# Altium schematic symbol library jlcpcb_2025_04_capacitors_extended_0603.schlib: 3668 symbols (part 4 of 20) (continued)
## 0603N7R5B500CT
designator C?  Capacitance: 7.5pF  (hidden comment: *)
Capacitor, Ceramic (MLCC), 7.5pF, 50V, NP0, SMD 0603; Manufacturer: Walsin Tech Corp; Manufacturer Part Number: 0603N7R5B500CT; Package Size: 0603; JLCPCB Basic Part: No; JLCPCB Part Number: C458910; Supplier 1: LCSC; Category: Capacitors - MLCC; Supplier Part Number 1: C458910; Voltage Rating: 50V; Temperature Coefficient: NP0; RoHS: Yes; ComponentLink1Description: Datasheet; ComponentLink1URL: https://wmsc.lcsc.com/wmsc/upload/file/pdf/v2/lcsc/2304140030_Walsin-Tech-Corp-0603N7R5B500CT_C458910.pdf; ComponentLink2Description: JLCPCB Part URL; ComponentLink2URL: https://jlcpcb.com/partdetail/C458910; ComponentLink3Description: LCSC Part URL; ComponentLink3URL: https://lcsc.com/product-detail/Multilayer-Ceramic-Capacitors-MLCC---SMD-SMT_Walsin-Tech-Corp-Walsin-Tech-Corp-0603N7R5B500CT_C458910.html
footprint CAP-0603 (0603 (1608M) Capacitor)
pins: 1, 2

## 0603N7R5C500CT
designator C?  Capacitance: 7.5pF  (hidden comment: *)
Capacitor, Ceramic (MLCC), 7.5pF, 50V, NP0, SMD 0603; Manufacturer: Walsin Tech Corp; Manufacturer Part Number: 0603N7R5C500CT; Package Size: 0603; JLCPCB Basic Part: No; JLCPCB Part Number: C296068; Supplier 1: LCSC; Category: Capacitors - MLCC; Supplier Part Number 1: C296068; Voltage Rating: 50V; Temperature Coefficient: NP0; RoHS: Yes; ComponentLink1Description: Datasheet; ComponentLink1URL: https://wmsc.lcsc.com/wmsc/upload/file/pdf/v2/lcsc/2304140030_Walsin-Tech-Corp-0603N7R5C500CT_C296068.pdf; ComponentLink2Description: JLCPCB Part URL; ComponentLink2URL: https://jlcpcb.com/partdetail/C296068; ComponentLink3Description: LCSC Part URL; ComponentLink3URL: https://lcsc.com/product-detail/Multilayer-Ceramic-Capacitors-MLCC---SMD-SMT_Walsin-Tech-Corp-Walsin-Tech-Corp-0603N7R5C500CT_C296068.html
footprint CAP-0603 (0603 (1608M) Capacitor)
pins: 1, 2

## 0603N8R0B500CT
designator C?  Capacitance: 8pF  (hidden comment: *)
Capacitor, Ceramic (MLCC), 8pF, 50V, NP0, SMD 0603; Manufacturer: Walsin Tech Corp; Manufacturer Part Number: 0603N8R0B500CT; Package Size: 0603; JLCPCB Basic Part: No; JLCPCB Part Number: C314305; Supplier 1: LCSC; Category: Capacitors - MLCC; Supplier Part Number 1: C314305; Voltage Rating: 50V; Temperature Coefficient: NP0; RoHS: Yes; ComponentLink1Description: Datasheet; ComponentLink1URL: https://wmsc.lcsc.com/wmsc/upload/file/pdf/v2/lcsc/2304140030_Walsin-Tech-Corp-0603N8R0B500CT_C314305.pdf; ComponentLink2Description: JLCPCB Part URL; ComponentLink2URL: https://jlcpcb.com/partdetail/C314305; ComponentLink3Description: LCSC Part URL; ComponentLink3URL: https://lcsc.com/product-detail/Multilayer-Ceramic-Capacitors-MLCC---SMD-SMT_Walsin-Tech-Corp-Walsin-Tech-Corp-0603N8R0B500CT_C314305.html
footprint CAP-0603 (0603 (1608M) Capacitor)
pins: 1, 2

## 0603N8R0C500CT
designator C?  Capacitance: 8pF  (hidden comment: *)
Capacitor, Ceramic (MLCC), 8pF, 50V, NP0, SMD 0603; Manufacturer: Walsin Tech Corp; Manufacturer Part Number: 0603N8R0C500CT; Package Size: 0603; JLCPCB Basic Part: No; JLCPCB Part Number: C388066; Supplier 1: LCSC; Category: Capacitors - MLCC; Supplier Part Number 1: C388066; Voltage Rating: 50V; Temperature Coefficient: NP0; RoHS: Yes; ComponentLink1Description: Datasheet; ComponentLink1URL: https://wmsc.lcsc.com/wmsc/upload/file/pdf/v2/lcsc/2304140030_Walsin-Tech-Corp-0603N8R0C500CT_C388066.pdf; ComponentLink2Description: JLCPCB Part URL; ComponentLink2URL: https://jlcpcb.com/partdetail/C388066; ComponentLink3Description: LCSC Part URL; ComponentLink3URL: https://lcsc.com/product-detail/Multilayer-Ceramic-Capacitors-MLCC---SMD-SMT_Walsin-Tech-Corp-Walsin-Tech-Corp-0603N8R0C500CT_C388066.html
footprint CAP-0603 (0603 (1608M) Capacitor)
pins: 1, 2

## 0603N8R0D500CT
designator C?  Capacitance: 8pF  (hidden comment: *)
Capacitor, Ceramic (MLCC), 8pF, 50V, NP0, SMD 0603; Manufacturer: Walsin Tech Corp; Manufacturer Part Number: 0603N8R0D500CT; Package Size: 0603; JLCPCB Basic Part: No; JLCPCB Part Number: C388067; Supplier 1: LCSC; Category: Capacitors - MLCC; Supplier Part Number 1: C388067; Voltage Rating: 50V; Temperature Coefficient: NP0; RoHS: Yes; ComponentLink1Description: Datasheet; ComponentLink1URL: https://wmsc.lcsc.com/wmsc/upload/file/pdf/v2/lcsc/2304140030_Walsin-Tech-Corp-0603N8R0D500CT_C388067.pdf; ComponentLink2Description: JLCPCB Part URL; ComponentLink2URL: https://jlcpcb.com/partdetail/C388067; ComponentLink3Description: LCSC Part URL; ComponentLink3URL: https://lcsc.com/product-detail/Multilayer-Ceramic-Capacitors-MLCC---SMD-SMT_Walsin-Tech-Corp-Walsin-Tech-Corp-0603N8R0D500CT_C388067.html
footprint CAP-0603 (0603 (1608M) Capacitor)
pins: 1, 2

## 0603N8R2B500CT
designator C?  Capacitance: 8.2pF  (hidden comment: *)
Capacitor, Ceramic (MLCC), 8.2pF, 50V, NP0, SMD 0603; Manufacturer: Walsin Tech Corp; Manufacturer Part Number: 0603N8R2B500CT; Package Size: 0603; JLCPCB Basic Part: No; JLCPCB Part Number: C123599; Supplier 1: LCSC; Category: Capacitors - MLCC; Supplier Part Number 1: C123599; Voltage Rating: 50V; Temperature Coefficient: NP0; RoHS: Yes; ComponentLink1Description: Datasheet; ComponentLink1URL: https://wmsc.lcsc.com/wmsc/upload/file/pdf/v2/lcsc/2304140030_Walsin-Tech-Corp-0603N8R2B500CT_C123599.pdf; ComponentLink2Description: JLCPCB Part URL; ComponentLink2URL: https://jlcpcb.com/partdetail/C123599; ComponentLink3Description: LCSC Part URL; ComponentLink3URL: https://lcsc.com/product-detail/Multilayer-Ceramic-Capacitors-MLCC---SMD-SMT_Walsin-Tech-Corp-Walsin-Tech-Corp-0603N8R2B500CT_C123599.html
footprint CAP-0603 (0603 (1608M) Capacitor)
pins: 1, 2

## 0603N8R2C500CT
designator C?  Capacitance: 8.2pF  (hidden comment: *)
Capacitor, Ceramic (MLCC), 8.2pF, 50V, NP0, SMD 0603; Manufacturer: Walsin Tech Corp; Manufacturer Part Number: 0603N8R2C500CT; Package Size: 0603; JLCPCB Basic Part: No; JLCPCB Part Number: C388068; Supplier 1: LCSC; Category: Capacitors - MLCC; Supplier Part Number 1: C388068; Voltage Rating: 50V; Temperature Coefficient: NP0; RoHS: Yes; ComponentLink1Description: Datasheet; ComponentLink1URL: https://wmsc.lcsc.com/wmsc/upload/file/pdf/v2/lcsc/2304140030_Walsin-Tech-Corp-0603N8R2C500CT_C388068.pdf; ComponentLink2Description: JLCPCB Part URL; ComponentLink2URL: https://jlcpcb.com/partdetail/C388068; ComponentLink3Description: LCSC Part URL; ComponentLink3URL: https://lcsc.com/product-detail/Multilayer-Ceramic-Capacitors-MLCC---SMD-SMT_Walsin-Tech-Corp-Walsin-Tech-Corp-0603N8R2C500CT_C388068.html
footprint CAP-0603 (0603 (1608M) Capacitor)
pins: 1, 2

## 0603N8R2D500CT
designator C?  Capacitance: 8.2pF  (hidden comment: *)
Capacitor, Ceramic (MLCC), 8.2pF, 50V, NP0, SMD 0603; Manufacturer: Walsin Tech Corp; Manufacturer Part Number: 0603N8R2D500CT; Package Size: 0603; JLCPCB Basic Part: No; JLCPCB Part Number: C123601; Supplier 1: LCSC; Category: Capacitors - MLCC; Supplier Part Number 1: C123601; Voltage Rating: 50V; Temperature Coefficient: NP0; RoHS: Yes; ComponentLink1Description: Datasheet; ComponentLink1URL: https://wmsc.lcsc.com/wmsc/upload/file/pdf/v2/lcsc/2304140030_Walsin-Tech-Corp-0603N8R2D500CT_C123601.pdf; ComponentLink2Description: JLCPCB Part URL; ComponentLink2URL: https://jlcpcb.com/partdetail/C123601; ComponentLink3Description: LCSC Part URL; ComponentLink3URL: https://lcsc.com/product-detail/Multilayer-Ceramic-Capacitors-MLCC---SMD-SMT_Walsin-Tech-Corp-Walsin-Tech-Corp-0603N8R2D500CT_C123601.html
footprint CAP-0603 (0603 (1608M) Capacitor)
pins: 1, 2

## 0603N9R0B500CT
designator C?  Capacitance: 9pF  (hidden comment: *)
Capacitor, Ceramic (MLCC), 9pF, 50V, NP0, SMD 0603; Manufacturer: Walsin Tech Corp; Manufacturer Part Number: 0603N9R0B500CT; Package Size: 0603; JLCPCB Basic Part: No; JLCPCB Part Number: C335534; Supplier 1: LCSC; Category: Capacitors - MLCC; Supplier Part Number 1: C335534; Voltage Rating: 50V; Temperature Coefficient: NP0; RoHS: Yes; ComponentLink1Description: Datasheet; ComponentLink1URL: https://wmsc.lcsc.com/wmsc/upload/file/pdf/v2/lcsc/2304140030_Walsin-Tech-Corp-0603N9R0B500CT_C335534.pdf; ComponentLink2Description: JLCPCB Part URL; ComponentLink2URL: https://jlcpcb.com/partdetail/C335534; ComponentLink3Description: LCSC Part URL; ComponentLink3URL: https://lcsc.com/product-detail/Multilayer-Ceramic-Capacitors-MLCC---SMD-SMT_Walsin-Tech-Corp-Walsin-Tech-Corp-0603N9R0B500CT_C335534.html
footprint CAP-0603 (0603 (1608M) Capacitor)
pins: 1, 2

## 0603N9R0C500CT
designator C?  Capacitance: 9pF  (hidden comment: *)
Capacitor, Ceramic (MLCC), 9pF, 50V, NP0, SMD 0603; Manufacturer: Walsin Tech Corp; Manufacturer Part Number: 0603N9R0C500CT; Package Size: 0603; JLCPCB Basic Part: No; JLCPCB Part Number: C880859; Supplier 1: LCSC; Category: Capacitors - MLCC; Supplier Part Number 1: C880859; Voltage Rating: 50V; Temperature Coefficient: NP0; RoHS: Yes; ComponentLink1Description: Datasheet; ComponentLink1URL: https://wmsc.lcsc.com/wmsc/upload/file/pdf/v2/lcsc/2304140030_Walsin-Tech-Corp-0603N9R0C500CT_C880859.pdf; ComponentLink2Description: JLCPCB Part URL; ComponentLink2URL: https://jlcpcb.com/partdetail/C880859; ComponentLink3Description: LCSC Part URL; ComponentLink3URL: https://lcsc.com/product-detail/Multilayer-Ceramic-Capacitors-MLCC---SMD-SMT_Walsin-Tech-Corp-Walsin-Tech-Corp-0603N9R0C500CT_C880859.html
footprint CAP-0603 (0603 (1608M) Capacitor)
pins: 1, 2

## 0603N9R1D500CT
designator C?  Capacitance: 9.1pF  (hidden comment: *)
Capacitor, Ceramic (MLCC), 9.1pF, 50V, NP0, SMD 0603; Manufacturer: Walsin Tech Corp; Manufacturer Part Number: 0603N9R1D500CT; Package Size: 0603; JLCPCB Basic Part: No; JLCPCB Part Number: C424829; Supplier 1: LCSC; Category: Capacitors - MLCC; Supplier Part Number 1: C424829; Voltage Rating: 50V; Temperature Coefficient: NP0; RoHS: Yes; ComponentLink1Description: Datasheet; ComponentLink1URL: https://wmsc.lcsc.com/wmsc/upload/file/pdf/v2/lcsc/2304140030_Walsin-Tech-Corp-0603N9R1D500CT_C424829.pdf; ComponentLink2Description: JLCPCB Part URL; ComponentLink2URL: https://jlcpcb.com/partdetail/C424829; ComponentLink3Description: LCSC Part URL; ComponentLink3URL: https://lcsc.com/product-detail/Multilayer-Ceramic-Capacitors-MLCC---SMD-SMT_Walsin-Tech-Corp-Walsin-Tech-Corp-0603N9R1D500CT_C424829.html
footprint CAP-0603 (0603 (1608M) Capacitor)
pins: 1, 2

## 0603N100D500CT
designator C?  Capacitance: 10pF  (hidden comment: *)
Capacitor, Ceramic (MLCC), 10pF, 50V, NP0, SMD 0603; Manufacturer: Walsin Tech Corp; Manufacturer Part Number: 0603N100D500CT; Package Size: 0603; JLCPCB Basic Part: No; JLCPCB Part Number: C296044; Supplier 1: LCSC; Category: Capacitors - MLCC; Supplier Part Number 1: C296044; Voltage Rating: 50V; Temperature Coefficient: NP0; RoHS: Yes; ComponentLink1Description: Datasheet; ComponentLink1URL: https://wmsc.lcsc.com/wmsc/upload/file/pdf/v2/lcsc/2304140030_Walsin-Tech-Corp-0603N100D500CT_C296044.pdf; ComponentLink2Description: JLCPCB Part URL; ComponentLink2URL: https://jlcpcb.com/partdetail/C296044; ComponentLink3Description: LCSC Part URL; ComponentLink3URL: https://lcsc.com/product-detail/Multilayer-Ceramic-Capacitors-MLCC---SMD-SMT_Walsin-Tech-Corp-Walsin-Tech-Corp-0603N100D500CT_C296044.html
footprint CAP-0603 (0603 (1608M) Capacitor)
pins: 1, 2

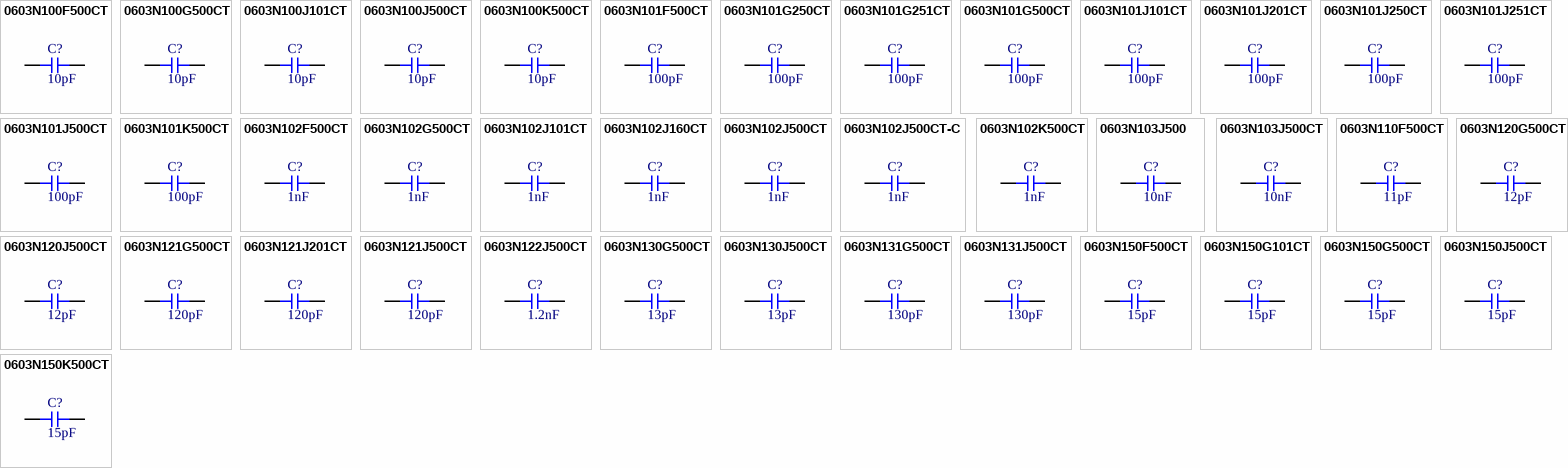
[diagram p16: symbols 0603N100F500CT to 0603N150K500CT]

## 0603N100F500CT
designator C?  Capacitance: 10pF  (hidden comment: *)
Capacitor, Ceramic (MLCC), 10pF, ±1%, 50V, NP0, ±1%, SMD 0603; Manufacturer: Walsin Tech Corp; Manufacturer Part Number: 0603N100F500CT; Package Size: 0603; JLCPCB Basic Part: No; JLCPCB Part Number: C458889; Supplier 1: LCSC; Category: Capacitors - MLCC; Supplier Part Number 1: C458889; Tolerance: ±1%; Voltage Rating: 50V; Temperature Coefficient: NP0; RoHS: Yes; ComponentLink1Description: Datasheet; ComponentLink1URL: https://wmsc.lcsc.com/wmsc/upload/file/pdf/v2/lcsc/2304140030_Walsin-Tech-Corp-0603N100F500CT_C458889.pdf; ComponentLink2Description: JLCPCB Part URL; ComponentLink2URL: https://jlcpcb.com/partdetail/C458889; ComponentLink3Description: LCSC Part URL; ComponentLink3URL: https://lcsc.com/product-detail/Multilayer-Ceramic-Capacitors-MLCC---SMD-SMT_Walsin-Tech-Corp-Walsin-Tech-Corp-0603N100F500CT_C458889.html
footprint CAP-0603 (0603 (1608M) Capacitor)
pins: 1, 2

## 0603N100G500CT
designator C?  Capacitance: 10pF  (hidden comment: *)
Capacitor, Ceramic (MLCC), 10pF, ±2%, 50V, NP0, ±2%, SMD 0603; Manufacturer: Walsin Tech Corp; Manufacturer Part Number: 0603N100G500CT; Package Size: 0603; JLCPCB Basic Part: No; JLCPCB Part Number: C237161; Supplier 1: LCSC; Category: Capacitors - MLCC; Supplier Part Number 1: C237161; Tolerance: ±2%; Voltage Rating: 50V; Temperature Coefficient: NP0; RoHS: Yes; ComponentLink1Description: Datasheet; ComponentLink1URL: https://wmsc.lcsc.com/wmsc/upload/file/pdf/v2/lcsc/2304140030_Walsin-Tech-Corp-0603N100G500CT_C237161.pdf; ComponentLink2Description: JLCPCB Part URL; ComponentLink2URL: https://jlcpcb.com/partdetail/C237161; ComponentLink3Description: LCSC Part URL; ComponentLink3URL: https://lcsc.com/product-detail/Multilayer-Ceramic-Capacitors-MLCC---SMD-SMT_Walsin-Tech-Corp-Walsin-Tech-Corp-0603N100G500CT_C237161.html
footprint CAP-0603 (0603 (1608M) Capacitor)
pins: 1, 2

## 0603N100J101CT
designator C?  Capacitance: 10pF  (hidden comment: *)
Capacitor, Ceramic (MLCC), 10pF, ±5%, 100V, NP0, ±5%, SMD 0603; Manufacturer: Walsin Tech Corp; Manufacturer Part Number: 0603N100J101CT; Package Size: 0603; JLCPCB Basic Part: No; JLCPCB Part Number: C338151; Supplier 1: LCSC; Category: Capacitors - MLCC; Supplier Part Number 1: C338151; Tolerance: ±5%; Voltage Rating: 100V; Temperature Coefficient: NP0; RoHS: Yes; ComponentLink1Description: Datasheet; ComponentLink1URL: https://wmsc.lcsc.com/wmsc/upload/file/pdf/v2/lcsc/2304140030_Walsin-Tech-Corp-0603N100J101CT_C338151.pdf; ComponentLink2Description: JLCPCB Part URL; ComponentLink2URL: https://jlcpcb.com/partdetail/C338151; ComponentLink3Description: LCSC Part URL; ComponentLink3URL: https://lcsc.com/product-detail/Multilayer-Ceramic-Capacitors-MLCC---SMD-SMT_Walsin-Tech-Corp-Walsin-Tech-Corp-0603N100J101CT_C338151.html
footprint CAP-0603 (0603 (1608M) Capacitor)
pins: 1, 2

## 0603N100J500CT
designator C?  Capacitance: 10pF  (hidden comment: *)
Capacitor, Ceramic (MLCC), 10pF, ±5%, 50V, NP0, ±5%, SMD 0603; Manufacturer: Walsin Tech Corp; Manufacturer Part Number: 0603N100J500CT; Package Size: 0603; JLCPCB Basic Part: No; JLCPCB Part Number: C152928; Supplier 1: LCSC; Category: Capacitors - MLCC; Supplier Part Number 1: C152928; Tolerance: ±5%; Voltage Rating: 50V; Temperature Coefficient: NP0; RoHS: Yes; ComponentLink1Description: Datasheet; ComponentLink1URL: https://wmsc.lcsc.com/wmsc/upload/file/pdf/v2/lcsc/2304140030_Walsin-Tech-Corp-0603N100J500CT_C152928.pdf; ComponentLink2Description: JLCPCB Part URL; ComponentLink2URL: https://jlcpcb.com/partdetail/C152928; ComponentLink3Description: LCSC Part URL; ComponentLink3URL: https://lcsc.com/product-detail/Multilayer-Ceramic-Capacitors-MLCC---SMD-SMT_Walsin-Tech-Corp-Walsin-Tech-Corp-0603N100J500CT_C152928.html
footprint CAP-0603 (0603 (1608M) Capacitor)
pins: 1, 2

## 0603N100K500CT
designator C?  Capacitance: 10pF  (hidden comment: *)
Capacitor, Ceramic (MLCC), 10pF, ±10%, 50V, NP0, ±10%, SMD 0603; Manufacturer: Walsin Tech Corp; Manufacturer Part Number: 0603N100K500CT; Package Size: 0603; JLCPCB Basic Part: No; JLCPCB Part Number: C296045; Supplier 1: LCSC; Category: Capacitors - MLCC; Supplier Part Number 1: C296045; Tolerance: ±10%; Voltage Rating: 50V; Temperature Coefficient: NP0; RoHS: Yes; ComponentLink1Description: Datasheet; ComponentLink1URL: https://wmsc.lcsc.com/wmsc/upload/file/pdf/v2/lcsc/2304140030_Walsin-Tech-Corp-0603N100K500CT_C296045.pdf; ComponentLink2Description: JLCPCB Part URL; ComponentLink2URL: https://jlcpcb.com/partdetail/C296045; ComponentLink3Description: LCSC Part URL; ComponentLink3URL: https://lcsc.com/product-detail/Multilayer-Ceramic-Capacitors-MLCC---SMD-SMT_Walsin-Tech-Corp-Walsin-Tech-Corp-0603N100K500CT_C296045.html
footprint CAP-0603 (0603 (1608M) Capacitor)
pins: 1, 2

## 0603N101F500CT
designator C?  Capacitance: 100pF  (hidden comment: *)
Capacitor, Ceramic (MLCC), 100pF, ±1%, 50V, NP0, ±1%, SMD 0603; Manufacturer: Walsin Tech Corp; Manufacturer Part Number: 0603N101F500CT; Package Size: 0603; JLCPCB Basic Part: No; JLCPCB Part Number: C555556; Supplier 1: LCSC; Category: Capacitors - MLCC; Supplier Part Number 1: C555556; Tolerance: ±1%; Voltage Rating: 50V; Temperature Coefficient: NP0; RoHS: Yes; ComponentLink1Description: Datasheet; ComponentLink1URL: https://wmsc.lcsc.com/wmsc/upload/file/pdf/v2/lcsc/2304140030_Walsin-Tech-Corp-0603N101F500CT_C555556.pdf; ComponentLink2Description: JLCPCB Part URL; ComponentLink2URL: https://jlcpcb.com/partdetail/C555556; ComponentLink3Description: LCSC Part URL; ComponentLink3URL: https://lcsc.com/product-detail/Multilayer-Ceramic-Capacitors-MLCC---SMD-SMT_Walsin-Tech-Corp-Walsin-Tech-Corp-0603N101F500CT_C555556.html
footprint CAP-0603 (0603 (1608M) Capacitor)
pins: 1, 2

## 0603N101G250CT
designator C?  Capacitance: 100pF  (hidden comment: *)
Capacitor, Ceramic (MLCC), 100pF, ±2%, 25V, NP0, ±2%, SMD 0603; Manufacturer: Walsin Tech Corp; Manufacturer Part Number: 0603N101G250CT; Package Size: 0603; JLCPCB Basic Part: No; JLCPCB Part Number: C458891; Supplier 1: LCSC; Category: Capacitors - MLCC; Supplier Part Number 1: C458891; Tolerance: ±2%; Voltage Rating: 25V; Temperature Coefficient: NP0; RoHS: Yes; ComponentLink1Description: Datasheet; ComponentLink1URL: https://wmsc.lcsc.com/wmsc/upload/file/pdf/v2/lcsc/2304140030_Walsin-Tech-Corp-0603N101G250CT_C458891.pdf; ComponentLink2Description: JLCPCB Part URL; ComponentLink2URL: https://jlcpcb.com/partdetail/C458891; ComponentLink3Description: LCSC Part URL; ComponentLink3URL: https://lcsc.com/product-detail/Multilayer-Ceramic-Capacitors-MLCC---SMD-SMT_Walsin-Tech-Corp-Walsin-Tech-Corp-0603N101G250CT_C458891.html
footprint CAP-0603 (0603 (1608M) Capacitor)
pins: 1, 2

## 0603N101G251CT
designator C?  Capacitance: 100pF  (hidden comment: *)
Capacitor, Ceramic (MLCC), 100pF, ±2%, 250V, NP0, ±2%, SMD 0603; Manufacturer: Walsin Tech Corp; Manufacturer Part Number: 0603N101G251CT; Package Size: 0603; JLCPCB Basic Part: No; JLCPCB Part Number: C469647; Supplier 1: LCSC; Category: Capacitors - MLCC; Supplier Part Number 1: C469647; Tolerance: ±2%; Voltage Rating: 250V; Temperature Coefficient: NP0; RoHS: Yes; ComponentLink1Description: Datasheet; ComponentLink1URL: https://wmsc.lcsc.com/wmsc/upload/file/pdf/v2/lcsc/2304140030_Walsin-Tech-Corp-0603N101G251CT_C469647.pdf; ComponentLink2Description: JLCPCB Part URL; ComponentLink2URL: https://jlcpcb.com/partdetail/C469647; ComponentLink3Description: LCSC Part URL; ComponentLink3URL: https://lcsc.com/product-detail/Multilayer-Ceramic-Capacitors-MLCC---SMD-SMT_Walsin-Tech-Corp-Walsin-Tech-Corp-0603N101G251CT_C469647.html
footprint CAP-0603 (0603 (1608M) Capacitor)
pins: 1, 2

## 0603N101G500CT
designator C?  Capacitance: 100pF  (hidden comment: *)
Capacitor, Ceramic (MLCC), 100pF, ±2%, 50V, NP0, ±2%, SMD 0603; Manufacturer: Walsin Tech Corp; Manufacturer Part Number: 0603N101G500CT; Package Size: 0603; JLCPCB Basic Part: No; JLCPCB Part Number: C296046; Supplier 1: LCSC; Category: Capacitors - MLCC; Supplier Part Number 1: C296046; Tolerance: ±2%; Voltage Rating: 50V; Temperature Coefficient: NP0; RoHS: Yes; ComponentLink1Description: Datasheet; ComponentLink1URL: https://wmsc.lcsc.com/wmsc/upload/file/pdf/v2/lcsc/2304140030_Walsin-Tech-Corp-0603N101G500CT_C296046.pdf; ComponentLink2Description: JLCPCB Part URL; ComponentLink2URL: https://jlcpcb.com/partdetail/C296046; ComponentLink3Description: LCSC Part URL; ComponentLink3URL: https://lcsc.com/product-detail/Multilayer-Ceramic-Capacitors-MLCC---SMD-SMT_Walsin-Tech-Corp-Walsin-Tech-Corp-0603N101G500CT_C296046.html
footprint CAP-0603 (0603 (1608M) Capacitor)
pins: 1, 2

## 0603N101J101CT
designator C?  Capacitance: 100pF  (hidden comment: *)
Capacitor, Ceramic (MLCC), 100pF, ±5%, 100V, NP0, ±5%, SMD 0603; Manufacturer: Walsin Tech Corp; Manufacturer Part Number: 0603N101J101CT; Package Size: 0603; JLCPCB Basic Part: No; JLCPCB Part Number: C77445; Supplier 1: LCSC; Category: Capacitors - MLCC; Supplier Part Number 1: C77445; Tolerance: ±5%; Voltage Rating: 100V; Temperature Coefficient: NP0; RoHS: Yes; ComponentLink1Description: Datasheet; ComponentLink1URL: https://wmsc.lcsc.com/wmsc/upload/file/pdf/v2/lcsc/2304140030_Walsin-Tech-Corp-0603N101J101CT_C77445.pdf; ComponentLink2Description: JLCPCB Part URL; ComponentLink2URL: https://jlcpcb.com/partdetail/C77445; ComponentLink3Description: LCSC Part URL; ComponentLink3URL: https://lcsc.com/product-detail/Multilayer-Ceramic-Capacitors-MLCC---SMD-SMT_Walsin-Tech-Corp-Walsin-Tech-Corp-0603N101J101CT_C77445.html
footprint CAP-0603 (0603 (1608M) Capacitor)
pins: 1, 2

## 0603N101J201CT
designator C?  Capacitance: 100pF  (hidden comment: *)
Capacitor, Ceramic (MLCC), 100pF, ±5%, 200V, NP0, ±5%, SMD 0603; Manufacturer: Walsin Tech Corp; Manufacturer Part Number: 0603N101J201CT; Package Size: 0603; JLCPCB Basic Part: No; JLCPCB Part Number: C396710; Supplier 1: LCSC; Category: Capacitors - MLCC; Supplier Part Number 1: C396710; Tolerance: ±5%; Voltage Rating: 200V; Temperature Coefficient: NP0; RoHS: Yes; ComponentLink1Description: Datasheet; ComponentLink1URL: https://wmsc.lcsc.com/wmsc/upload/file/pdf/v2/lcsc/2304140030_Walsin-Tech-Corp-0603N101J201CT_C396710.pdf; ComponentLink2Description: JLCPCB Part URL; ComponentLink2URL: https://jlcpcb.com/partdetail/C396710; ComponentLink3Description: LCSC Part URL; ComponentLink3URL: https://lcsc.com/product-detail/Multilayer-Ceramic-Capacitors-MLCC---SMD-SMT_Walsin-Tech-Corp-Walsin-Tech-Corp-0603N101J201CT_C396710.html
footprint CAP-0603 (0603 (1608M) Capacitor)
pins: 1, 2

## 0603N101J250CT
designator C?  Capacitance: 100pF  (hidden comment: *)
Capacitor, Ceramic (MLCC), 100pF, ±5%, 25V, NP0, ±5%, SMD 0603; Manufacturer: Walsin Tech Corp; Manufacturer Part Number: 0603N101J250CT; Package Size: 0603; JLCPCB Basic Part: No; JLCPCB Part Number: C458892; Supplier 1: LCSC; Category: Capacitors - MLCC; Supplier Part Number 1: C458892; Tolerance: ±5%; Voltage Rating: 25V; Temperature Coefficient: NP0; RoHS: Yes; ComponentLink1Description: Datasheet; ComponentLink1URL: https://wmsc.lcsc.com/wmsc/upload/file/pdf/v2/lcsc/2304140030_Walsin-Tech-Corp-0603N101J250CT_C458892.pdf; ComponentLink2Description: JLCPCB Part URL; ComponentLink2URL: https://jlcpcb.com/partdetail/C458892; ComponentLink3Description: LCSC Part URL; ComponentLink3URL: https://lcsc.com/product-detail/Multilayer-Ceramic-Capacitors-MLCC---SMD-SMT_Walsin-Tech-Corp-Walsin-Tech-Corp-0603N101J250CT_C458892.html
footprint CAP-0603 (0603 (1608M) Capacitor)
pins: 1, 2

## 0603N101J251CT
designator C?  Capacitance: 100pF  (hidden comment: *)
Capacitor, Ceramic (MLCC), 100pF, ±5%, 250V, NP0, ±5%, SMD 0603; Manufacturer: Walsin Tech Corp; Manufacturer Part Number: 0603N101J251CT; Package Size: 0603; JLCPCB Basic Part: No; JLCPCB Part Number: C77446; Supplier 1: LCSC; Category: Capacitors - MLCC; Supplier Part Number 1: C77446; Tolerance: ±5%; Voltage Rating: 250V; Temperature Coefficient: NP0; RoHS: Yes; ComponentLink1Description: Datasheet; ComponentLink1URL: https://wmsc.lcsc.com/wmsc/upload/file/pdf/v2/lcsc/2304140030_Walsin-Tech-Corp-0603N101J251CT_C77446.pdf; ComponentLink2Description: JLCPCB Part URL; ComponentLink2URL: https://jlcpcb.com/partdetail/C77446; ComponentLink3Description: LCSC Part URL; ComponentLink3URL: https://lcsc.com/product-detail/Multilayer-Ceramic-Capacitors-MLCC---SMD-SMT_Walsin-Tech-Corp-Walsin-Tech-Corp-0603N101J251CT_C77446.html
footprint CAP-0603 (0603 (1608M) Capacitor)
pins: 1, 2

## 0603N101J500CT
designator C?  Capacitance: 100pF  (hidden comment: *)
Capacitor, Ceramic (MLCC), 100pF, ±5%, 50V, NP0, ±5%, SMD 0603; Manufacturer: Walsin Tech Corp; Manufacturer Part Number: 0603N101J500CT; Package Size: 0603; JLCPCB Basic Part: No; JLCPCB Part Number: C335544; Supplier 1: LCSC; Category: Capacitors - MLCC; Supplier Part Number 1: C335544; Tolerance: ±5%; Voltage Rating: 50V; Temperature Coefficient: NP0; RoHS: Yes; ComponentLink1Description: Datasheet; ComponentLink1URL: https://wmsc.lcsc.com/wmsc/upload/file/pdf/v2/lcsc/2304140030_Walsin-Tech-Corp-0603N101J500CT_C335544.pdf; ComponentLink2Description: JLCPCB Part URL; ComponentLink2URL: https://jlcpcb.com/partdetail/C335544; ComponentLink3Description: LCSC Part URL; ComponentLink3URL: https://lcsc.com/product-detail/Multilayer-Ceramic-Capacitors-MLCC---SMD-SMT_Walsin-Tech-Corp-Walsin-Tech-Corp-0603N101J500CT_C335544.html
footprint CAP-0603 (0603 (1608M) Capacitor)
pins: 1, 2

## 0603N101K500CT
designator C?  Capacitance: 100pF  (hidden comment: *)
Capacitor, Ceramic (MLCC), 100pF, ±10%, 50V, NP0, ±10%, SMD 0603; Manufacturer: Walsin Tech Corp; Manufacturer Part Number: 0603N101K500CT; Package Size: 0603; JLCPCB Basic Part: No; JLCPCB Part Number: C296047; Supplier 1: LCSC; Category: Capacitors - MLCC; Supplier Part Number 1: C296047; Tolerance: ±10%; Voltage Rating: 50V; Temperature Coefficient: NP0; RoHS: Yes; ComponentLink1Description: Datasheet; ComponentLink1URL: https://wmsc.lcsc.com/wmsc/upload/file/pdf/v2/lcsc/2304140030_Walsin-Tech-Corp-0603N101K500CT_C296047.pdf; ComponentLink2Description: JLCPCB Part URL; ComponentLink2URL: https://jlcpcb.com/partdetail/C296047; ComponentLink3Description: LCSC Part URL; ComponentLink3URL: https://lcsc.com/product-detail/Multilayer-Ceramic-Capacitors-MLCC---SMD-SMT_Walsin-Tech-Corp-Walsin-Tech-Corp-0603N101K500CT_C296047.html
footprint CAP-0603 (0603 (1608M) Capacitor)
pins: 1, 2

## 0603N102F500CT
designator C?  Capacitance: 1nF  (hidden comment: *)
Capacitor, Ceramic (MLCC), 1nF, ±1%, 50V, NP0, ±1%, SMD 0603; Manufacturer: Walsin Tech Corp; Manufacturer Part Number: 0603N102F500CT; Package Size: 0603; JLCPCB Basic Part: No; JLCPCB Part Number: C384777; Supplier 1: LCSC; Category: Capacitors - MLCC; Supplier Part Number 1: C384777; Tolerance: ±1%; Voltage Rating: 50V; Temperature Coefficient: NP0; RoHS: Yes; ComponentLink1Description: Datasheet; ComponentLink1URL: https://wmsc.lcsc.com/wmsc/upload/file/pdf/v2/lcsc/2304140030_Walsin-Tech-Corp-0603N102F500CT_C384777.pdf; ComponentLink2Description: JLCPCB Part URL; ComponentLink2URL: https://jlcpcb.com/partdetail/C384777; ComponentLink3Description: LCSC Part URL; ComponentLink3URL: https://lcsc.com/product-detail/Multilayer-Ceramic-Capacitors-MLCC---SMD-SMT_Walsin-Tech-Corp-Walsin-Tech-Corp-0603N102F500CT_C384777.html
footprint CAP-0603 (0603 (1608M) Capacitor)
pins: 1, 2

## 0603N102G500CT
designator C?  Capacitance: 1nF  (hidden comment: *)
Capacitor, Ceramic (MLCC), 1nF, ±2%, 50V, NP0, ±2%, SMD 0603; Manufacturer: Walsin Tech Corp; Manufacturer Part Number: 0603N102G500CT; Package Size: 0603; JLCPCB Basic Part: No; JLCPCB Part Number: C338154; Supplier 1: LCSC; Category: Capacitors - MLCC; Supplier Part Number 1: C338154; Tolerance: ±2%; Voltage Rating: 50V; Temperature Coefficient: NP0; RoHS: Yes; ComponentLink1Description: Datasheet; ComponentLink1URL: https://wmsc.lcsc.com/wmsc/upload/file/pdf/v2/lcsc/2304140030_Walsin-Tech-Corp-0603N102G500CT_C338154.pdf; ComponentLink2Description: JLCPCB Part URL; ComponentLink2URL: https://jlcpcb.com/partdetail/C338154; ComponentLink3Description: LCSC Part URL; ComponentLink3URL: https://lcsc.com/product-detail/Multilayer-Ceramic-Capacitors-MLCC---SMD-SMT_Walsin-Tech-Corp-Walsin-Tech-Corp-0603N102G500CT_C338154.html
footprint CAP-0603 (0603 (1608M) Capacitor)
pins: 1, 2

## 0603N102J101CT
designator C?  Capacitance: 1nF  (hidden comment: *)
Capacitor, Ceramic (MLCC), 1nF, ±5%, 100V, NP0, ±5%, SMD 0603; Manufacturer: Walsin Tech Corp; Manufacturer Part Number: 0603N102J101CT; Package Size: 0603; JLCPCB Basic Part: No; JLCPCB Part Number: C388030; Supplier 1: LCSC; Category: Capacitors - MLCC; Supplier Part Number 1: C388030; Tolerance: ±5%; Voltage Rating: 100V; Temperature Coefficient: NP0; RoHS: Yes; ComponentLink1Description: Datasheet; ComponentLink1URL: https://wmsc.lcsc.com/wmsc/upload/file/pdf/v2/lcsc/2304140030_Walsin-Tech-Corp-0603N102J101CT_C388030.pdf; ComponentLink2Description: JLCPCB Part URL; ComponentLink2URL: https://jlcpcb.com/partdetail/C388030; ComponentLink3Description: LCSC Part URL; ComponentLink3URL: https://lcsc.com/product-detail/Multilayer-Ceramic-Capacitors-MLCC---SMD-SMT_Walsin-Tech-Corp-Walsin-Tech-Corp-0603N102J101CT_C388030.html
footprint CAP-0603 (0603 (1608M) Capacitor)
pins: 1, 2

## 0603N102J160CT
designator C?  Capacitance: 1nF  (hidden comment: *)
Capacitor, Ceramic (MLCC), 1nF, ±5%, 16V, NP0, ±5%, SMD 0603; Manufacturer: Walsin Tech Corp; Manufacturer Part Number: 0603N102J160CT; Package Size: 0603; JLCPCB Basic Part: No; JLCPCB Part Number: C302049; Supplier 1: LCSC; Category: Capacitors - MLCC; Supplier Part Number 1: C302049; Tolerance: ±5%; Voltage Rating: 16V; Temperature Coefficient: NP0; RoHS: Yes; ComponentLink1Description: Datasheet; ComponentLink1URL: https://wmsc.lcsc.com/wmsc/upload/file/pdf/v2/lcsc/2304140030_Walsin-Tech-Corp-0603N102J160CT_C302049.pdf; ComponentLink2Description: JLCPCB Part URL; ComponentLink2URL: https://jlcpcb.com/partdetail/C302049; ComponentLink3Description: LCSC Part URL; ComponentLink3URL: https://lcsc.com/product-detail/Multilayer-Ceramic-Capacitors-MLCC---SMD-SMT_Walsin-Tech-Corp-Walsin-Tech-Corp-0603N102J160CT_C302049.html
footprint CAP-0603 (0603 (1608M) Capacitor)
pins: 1, 2

## 0603N102J500CT
designator C?  Capacitance: 1nF  (hidden comment: *)
Capacitor, Ceramic (MLCC), 1nF, ±5%, 50V, NP0, ±5%, SMD 0603; Manufacturer: Walsin Tech Corp; Manufacturer Part Number: 0603N102J500CT; Package Size: 0603; JLCPCB Basic Part: No; JLCPCB Part Number: C340644; Supplier 1: LCSC; Category: Capacitors - MLCC; Supplier Part Number 1: C340644; Tolerance: ±5%; Voltage Rating: 50V; Temperature Coefficient: NP0; RoHS: Yes; ComponentLink1Description: Datasheet; ComponentLink1URL: https://wmsc.lcsc.com/wmsc/upload/file/pdf/v2/lcsc/2304140030_Walsin-Tech-Corp-0603N102J500CT_C340644.pdf; ComponentLink2Description: JLCPCB Part URL; ComponentLink2URL: https://jlcpcb.com/partdetail/C340644; ComponentLink3Description: LCSC Part URL; ComponentLink3URL: https://lcsc.com/product-detail/Multilayer-Ceramic-Capacitors-MLCC---SMD-SMT_Walsin-Tech-Corp-Walsin-Tech-Corp-0603N102J500CT_C340644.html
footprint CAP-0603 (0603 (1608M) Capacitor)
pins: 1, 2

## 0603N102J500CT-C
designator C?  Capacitance: 1nF  (hidden comment: *)
Capacitor, Ceramic (MLCC), 1nF, 50V, NP0, SMD 0603; Manufacturer: Walsin Tech Corp; Manufacturer Part Number: 0603N102J500CT-C; Package Size: 0603; JLCPCB Basic Part: No; JLCPCB Part Number: C2991349; Supplier 1: LCSC; Category: Capacitors - MLCC; Supplier Part Number 1: C2991349; Voltage Rating: 50V; Temperature Coefficient: NP0; RoHS: Yes; ComponentLink1Description: Datasheet; ComponentLink1URL: https://wmsc.lcsc.com/wmsc/upload/file/pdf/v2/lcsc/2204131745_Walsin-Tech-Corp-0603N102J500CT-C_C2991349.pdf; ComponentLink2Description: JLCPCB Part URL; ComponentLink2URL: https://jlcpcb.com/partdetail/C2991349; ComponentLink3Description: LCSC Part URL; ComponentLink3URL: https://lcsc.com/product-detail/Multilayer-Ceramic-Capacitors-MLCC---SMD-SMT_Walsin-Tech-Corp-Walsin-Tech-Corp-0603N102J500CT-C_C2991349.html
footprint CAP-0603 (0603 (1608M) Capacitor)
pins: 1, 2

## 0603N102K500CT
designator C?  Capacitance: 1nF  (hidden comment: *)
Capacitor, Ceramic (MLCC), 1nF, ±10%, 50V, NP0, ±10%, SMD 0603; Manufacturer: Walsin Tech Corp; Manufacturer Part Number: 0603N102K500CT; Package Size: 0603; JLCPCB Basic Part: No; JLCPCB Part Number: C296048; Supplier 1: LCSC; Category: Capacitors - MLCC; Supplier Part Number 1: C296048; Tolerance: ±10%; Voltage Rating: 50V; Temperature Coefficient: NP0; RoHS: Yes; ComponentLink1Description: Datasheet; ComponentLink1URL: https://wmsc.lcsc.com/wmsc/upload/file/pdf/v2/lcsc/2304140030_Walsin-Tech-Corp-0603N102K500CT_C296048.pdf; ComponentLink2Description: JLCPCB Part URL; ComponentLink2URL: https://jlcpcb.com/partdetail/C296048; ComponentLink3Description: LCSC Part URL; ComponentLink3URL: https://lcsc.com/product-detail/Multilayer-Ceramic-Capacitors-MLCC---SMD-SMT_Walsin-Tech-Corp-Walsin-Tech-Corp-0603N102K500CT_C296048.html
footprint CAP-0603 (0603 (1608M) Capacitor)
pins: 1, 2

## 0603N103J500
designator C?  Capacitance: 10nF  (hidden comment: *)
Capacitor, Ceramic (MLCC), 10nF, ±5%, 50V, NP0, ±5%, SMD 0603; Manufacturer: Walsin Tech Corp; Manufacturer Part Number: 0603N103J500; Package Size: 0603; JLCPCB Basic Part: No; JLCPCB Part Number: C168904; Supplier 1: LCSC; Category: Capacitors - MLCC; Supplier Part Number 1: C168904; Tolerance: ±5%; Voltage Rating: 50V; Temperature Coefficient: NP0; RoHS: Yes; ComponentLink1Description: Datasheet; ComponentLink1URL: https://wmsc.lcsc.com/wmsc/upload/file/pdf/v2/lcsc/2304140030_Walsin-Tech-Corp-0603N103J500_C168904.pdf; ComponentLink2Description: JLCPCB Part URL; ComponentLink2URL: https://jlcpcb.com/partdetail/C168904; ComponentLink3Description: LCSC Part URL; ComponentLink3URL: https://lcsc.com/product-detail/Multilayer-Ceramic-Capacitors-MLCC---SMD-SMT_Walsin-Tech-Corp-Walsin-Tech-Corp-0603N103J500_C168904.html
footprint CAP-0603 (0603 (1608M) Capacitor)
pins: 1, 2

## 0603N103J500CT
designator C?  Capacitance: 10nF  (hidden comment: *)
Capacitor, Ceramic (MLCC), 10nF, 50V, NP0, SMD 0603; Manufacturer: Walsin Tech Corp; Manufacturer Part Number: 0603N103J500CT; Package Size: 0603; JLCPCB Basic Part: No; JLCPCB Part Number: C2894187; Supplier 1: LCSC; Category: Capacitors - MLCC; Supplier Part Number 1: C2894187; Voltage Rating: 50V; Temperature Coefficient: NP0; RoHS: Yes; ComponentLink1Description: Datasheet; ComponentLink1URL: https://wmsc.lcsc.com/wmsc/upload/file/pdf/v2/lcsc/2109081830_Walsin-Tech-Corp-0603N103J500CT_C2894187.pdf; ComponentLink2Description: JLCPCB Part URL; ComponentLink2URL: https://jlcpcb.com/partdetail/C2894187; ComponentLink3Description: LCSC Part URL; ComponentLink3URL: https://lcsc.com/product-detail/Multilayer-Ceramic-Capacitors-MLCC---SMD-SMT_Walsin-Tech-Corp-Walsin-Tech-Corp-0603N103J500CT_C2894187.html
footprint CAP-0603 (0603 (1608M) Capacitor)
pins: 1, 2

## 0603N110F500CT
designator C?  Capacitance: 11pF  (hidden comment: *)
Capacitor, Ceramic (MLCC), 11pF, ±1%, 50V, NP0, ±1%, SMD 0603; Manufacturer: Walsin Tech Corp; Manufacturer Part Number: 0603N110F500CT; Package Size: 0603; JLCPCB Basic Part: No; JLCPCB Part Number: C123528; Supplier 1: LCSC; Category: Capacitors - MLCC; Supplier Part Number 1: C123528; Tolerance: ±1%; Voltage Rating: 50V; Temperature Coefficient: NP0; RoHS: Yes; ComponentLink1Description: Datasheet; ComponentLink1URL: https://wmsc.lcsc.com/wmsc/upload/file/pdf/v2/lcsc/2304140030_Walsin-Tech-Corp-0603N110F500CT_C123528.pdf; ComponentLink2Description: JLCPCB Part URL; ComponentLink2URL: https://jlcpcb.com/partdetail/C123528; ComponentLink3Description: LCSC Part URL; ComponentLink3URL: https://lcsc.com/product-detail/Multilayer-Ceramic-Capacitors-MLCC---SMD-SMT_Walsin-Tech-Corp-Walsin-Tech-Corp-0603N110F500CT_C123528.html
footprint CAP-0603 (0603 (1608M) Capacitor)
pins: 1, 2

## 0603N120G500CT
designator C?  Capacitance: 12pF  (hidden comment: *)
Capacitor, Ceramic (MLCC), 12pF, ±2%, 50V, NP0, ±2%, SMD 0603; Manufacturer: Walsin Tech Corp; Manufacturer Part Number: 0603N120G500CT; Package Size: 0603; JLCPCB Basic Part: No; JLCPCB Part Number: C302050; Supplier 1: LCSC; Category: Capacitors - MLCC; Supplier Part Number 1: C302050; Tolerance: ±2%; Voltage Rating: 50V; Temperature Coefficient: NP0; RoHS: Yes; ComponentLink1Description: Datasheet; ComponentLink1URL: https://wmsc.lcsc.com/wmsc/upload/file/pdf/v2/lcsc/2304140030_Walsin-Tech-Corp-0603N120G500CT_C302050.pdf; ComponentLink2Description: JLCPCB Part URL; ComponentLink2URL: https://jlcpcb.com/partdetail/C302050; ComponentLink3Description: LCSC Part URL; ComponentLink3URL: https://lcsc.com/product-detail/Multilayer-Ceramic-Capacitors-MLCC---SMD-SMT_Walsin-Tech-Corp-Walsin-Tech-Corp-0603N120G500CT_C302050.html
footprint CAP-0603 (0603 (1608M) Capacitor)
pins: 1, 2

## 0603N120J500CT
designator C?  Capacitance: 12pF  (hidden comment: *)
Capacitor, Ceramic (MLCC), 12pF, ±5%, 50V, NP0, ±5%, SMD 0603; Manufacturer: Walsin Tech Corp; Manufacturer Part Number: 0603N120J500CT; Package Size: 0603; JLCPCB Basic Part: No; JLCPCB Part Number: C123529; Supplier 1: LCSC; Category: Capacitors - MLCC; Supplier Part Number 1: C123529; Tolerance: ±5%; Voltage Rating: 50V; Temperature Coefficient: NP0; RoHS: Yes; ComponentLink1Description: Datasheet; ComponentLink1URL: https://wmsc.lcsc.com/wmsc/upload/file/pdf/v2/lcsc/2304140030_Walsin-Tech-Corp-0603N120J500CT_C123529.pdf; ComponentLink2Description: JLCPCB Part URL; ComponentLink2URL: https://jlcpcb.com/partdetail/C123529; ComponentLink3Description: LCSC Part URL; ComponentLink3URL: https://lcsc.com/product-detail/Multilayer-Ceramic-Capacitors-MLCC---SMD-SMT_Walsin-Tech-Corp-Walsin-Tech-Corp-0603N120J500CT_C123529.html
footprint CAP-0603 (0603 (1608M) Capacitor)
pins: 1, 2

## 0603N121G500CT
designator C?  Capacitance: 120pF  (hidden comment: *)
Capacitor, Ceramic (MLCC), 120pF, ±2%, 50V, NP0, ±2%, SMD 0603; Manufacturer: Walsin Tech Corp; Manufacturer Part Number: 0603N121G500CT; Package Size: 0603; JLCPCB Basic Part: No; JLCPCB Part Number: C302051; Supplier 1: LCSC; Category: Capacitors - MLCC; Supplier Part Number 1: C302051; Tolerance: ±2%; Voltage Rating: 50V; Temperature Coefficient: NP0; RoHS: Yes; ComponentLink1Description: Datasheet; ComponentLink1URL: https://wmsc.lcsc.com/wmsc/upload/file/pdf/v2/lcsc/2304140030_Walsin-Tech-Corp-0603N121G500CT_C302051.pdf; ComponentLink2Description: JLCPCB Part URL; ComponentLink2URL: https://jlcpcb.com/partdetail/C302051; ComponentLink3Description: LCSC Part URL; ComponentLink3URL: https://lcsc.com/product-detail/Multilayer-Ceramic-Capacitors-MLCC---SMD-SMT_Walsin-Tech-Corp-Walsin-Tech-Corp-0603N121G500CT_C302051.html
footprint CAP-0603 (0603 (1608M) Capacitor)
pins: 1, 2

## 0603N121J201CT
designator C?  Capacitance: 120pF  (hidden comment: *)
Capacitor, Ceramic (MLCC), 120pF, ±5%, 200V, NP0, ±5%, SMD 0603; Manufacturer: Walsin Tech Corp; Manufacturer Part Number: 0603N121J201CT; Package Size: 0603; JLCPCB Basic Part: No; JLCPCB Part Number: C388031; Supplier 1: LCSC; Category: Capacitors - MLCC; Supplier Part Number 1: C388031; Tolerance: ±5%; Voltage Rating: 200V; Temperature Coefficient: NP0; RoHS: Yes; ComponentLink1Description: Datasheet; ComponentLink1URL: https://wmsc.lcsc.com/wmsc/upload/file/pdf/v2/lcsc/2304140030_Walsin-Tech-Corp-0603N121J201CT_C388031.pdf; ComponentLink2Description: JLCPCB Part URL; ComponentLink2URL: https://jlcpcb.com/partdetail/C388031; ComponentLink3Description: LCSC Part URL; ComponentLink3URL: https://lcsc.com/product-detail/Multilayer-Ceramic-Capacitors-MLCC---SMD-SMT_Walsin-Tech-Corp-Walsin-Tech-Corp-0603N121J201CT_C388031.html
footprint CAP-0603 (0603 (1608M) Capacitor)
pins: 1, 2

## 0603N121J500CT
designator C?  Capacitance: 120pF  (hidden comment: *)
Capacitor, Ceramic (MLCC), 120pF, ±5%, 50V, NP0, ±5%, SMD 0603; Manufacturer: Walsin Tech Corp; Manufacturer Part Number: 0603N121J500CT; Package Size: 0603; JLCPCB Basic Part: No; JLCPCB Part Number: C296049; Supplier 1: LCSC; Category: Capacitors - MLCC; Supplier Part Number 1: C296049; Tolerance: ±5%; Voltage Rating: 50V; Temperature Coefficient: NP0; RoHS: Yes; ComponentLink1Description: Datasheet; ComponentLink1URL: https://wmsc.lcsc.com/wmsc/upload/file/pdf/v2/lcsc/2304140030_Walsin-Tech-Corp-0603N121J500CT_C296049.pdf; ComponentLink2Description: JLCPCB Part URL; ComponentLink2URL: https://jlcpcb.com/partdetail/C296049; ComponentLink3Description: LCSC Part URL; ComponentLink3URL: https://lcsc.com/product-detail/Multilayer-Ceramic-Capacitors-MLCC---SMD-SMT_Walsin-Tech-Corp-Walsin-Tech-Corp-0603N121J500CT_C296049.html
footprint CAP-0603 (0603 (1608M) Capacitor)
pins: 1, 2

## 0603N122J500CT
designator C?  Capacitance: 1.2nF  (hidden comment: *)
Capacitor, Ceramic (MLCC), 1.2nF, ±5%, 50V, NP0, ±5%, SMD 0603; Manufacturer: Walsin Tech Corp; Manufacturer Part Number: 0603N122J500CT; Package Size: 0603; JLCPCB Basic Part: No; JLCPCB Part Number: C152925; Supplier 1: LCSC; Category: Capacitors - MLCC; Supplier Part Number 1: C152925; Tolerance: ±5%; Voltage Rating: 50V; Temperature Coefficient: NP0; RoHS: Yes; ComponentLink1Description: Datasheet; ComponentLink1URL: https://wmsc.lcsc.com/wmsc/upload/file/pdf/v2/lcsc/2304140030_Walsin-Tech-Corp-0603N122J500CT_C152925.pdf; ComponentLink2Description: JLCPCB Part URL; ComponentLink2URL: https://jlcpcb.com/partdetail/C152925; ComponentLink3Description: LCSC Part URL; ComponentLink3URL: https://lcsc.com/product-detail/Multilayer-Ceramic-Capacitors-MLCC---SMD-SMT_Walsin-Tech-Corp-Walsin-Tech-Corp-0603N122J500CT_C152925.html
footprint CAP-0603 (0603 (1608M) Capacitor)
pins: 1, 2

## 0603N130G500CT
designator C?  Capacitance: 13pF  (hidden comment: *)
Capacitor, Ceramic (MLCC), 13pF, ±2%, 50V, NP0, ±2%, SMD 0603; Manufacturer: Walsin Tech Corp; Manufacturer Part Number: 0603N130G500CT; Package Size: 0603; JLCPCB Basic Part: No; JLCPCB Part Number: C123531; Supplier 1: LCSC; Category: Capacitors - MLCC; Supplier Part Number 1: C123531; Tolerance: ±2%; Voltage Rating: 50V; Temperature Coefficient: NP0; RoHS: Yes; ComponentLink1Description: Datasheet; ComponentLink1URL: https://wmsc.lcsc.com/wmsc/upload/file/pdf/v2/lcsc/2304140030_Walsin-Tech-Corp-0603N130G500CT_C123531.pdf; ComponentLink2Description: JLCPCB Part URL; ComponentLink2URL: https://jlcpcb.com/partdetail/C123531; ComponentLink3Description: LCSC Part URL; ComponentLink3URL: https://lcsc.com/product-detail/Multilayer-Ceramic-Capacitors-MLCC---SMD-SMT_Walsin-Tech-Corp-Walsin-Tech-Corp-0603N130G500CT_C123531.html
footprint CAP-0603 (0603 (1608M) Capacitor)
pins: 1, 2

## 0603N130J500CT
designator C?  Capacitance: 13pF  (hidden comment: *)
Capacitor, Ceramic (MLCC), 13pF, ±5%, 50V, NP0, ±5%, SMD 0603; Manufacturer: Walsin Tech Corp; Manufacturer Part Number: 0603N130J500CT; Package Size: 0603; JLCPCB Basic Part: No; JLCPCB Part Number: C237178; Supplier 1: LCSC; Category: Capacitors - MLCC; Supplier Part Number 1: C237178; Tolerance: ±5%; Voltage Rating: 50V; Temperature Coefficient: NP0; RoHS: Yes; ComponentLink1Description: Datasheet; ComponentLink1URL: https://wmsc.lcsc.com/wmsc/upload/file/pdf/v2/lcsc/2304140030_Walsin-Tech-Corp-0603N130J500CT_C237178.pdf; ComponentLink2Description: JLCPCB Part URL; ComponentLink2URL: https://jlcpcb.com/partdetail/C237178; ComponentLink3Description: LCSC Part URL; ComponentLink3URL: https://lcsc.com/product-detail/Multilayer-Ceramic-Capacitors-MLCC---SMD-SMT_Walsin-Tech-Corp-Walsin-Tech-Corp-0603N130J500CT_C237178.html
footprint CAP-0603 (0603 (1608M) Capacitor)
pins: 1, 2

## 0603N131G500CT
designator C?  Capacitance: 130pF  (hidden comment: *)
Capacitor, Ceramic (MLCC), 130pF, ±2%, 50V, NP0, ±2%, SMD 0603; Manufacturer: Walsin Tech Corp; Manufacturer Part Number: 0603N131G500CT; Package Size: 0603; JLCPCB Basic Part: No; JLCPCB Part Number: C302053; Supplier 1: LCSC; Category: Capacitors - MLCC; Supplier Part Number 1: C302053; Tolerance: ±2%; Voltage Rating: 50V; Temperature Coefficient: NP0; RoHS: Yes; ComponentLink1Description: Datasheet; ComponentLink1URL: https://wmsc.lcsc.com/wmsc/upload/file/pdf/v2/lcsc/2304140030_Walsin-Tech-Corp-0603N131G500CT_C302053.pdf; ComponentLink2Description: JLCPCB Part URL; ComponentLink2URL: https://jlcpcb.com/partdetail/C302053; ComponentLink3Description: LCSC Part URL; ComponentLink3URL: https://lcsc.com/product-detail/Multilayer-Ceramic-Capacitors-MLCC---SMD-SMT_Walsin-Tech-Corp-Walsin-Tech-Corp-0603N131G500CT_C302053.html
footprint CAP-0603 (0603 (1608M) Capacitor)
pins: 1, 2

## 0603N131J500CT
designator C?  Capacitance: 130pF  (hidden comment: *)
Capacitor, Ceramic (MLCC), 130pF, ±5%, 50V, NP0, ±5%, SMD 0603; Manufacturer: Walsin Tech Corp; Manufacturer Part Number: 0603N131J500CT; Package Size: 0603; JLCPCB Basic Part: No; JLCPCB Part Number: C237179; Supplier 1: LCSC; Category: Capacitors - MLCC; Supplier Part Number 1: C237179; Tolerance: ±5%; Voltage Rating: 50V; Temperature Coefficient: NP0; RoHS: Yes; ComponentLink1Description: Datasheet; ComponentLink1URL: https://wmsc.lcsc.com/wmsc/upload/file/pdf/v2/lcsc/2304140030_Walsin-Tech-Corp-0603N131J500CT_C237179.pdf; ComponentLink2Description: JLCPCB Part URL; ComponentLink2URL: https://jlcpcb.com/partdetail/C237179; ComponentLink3Description: LCSC Part URL; ComponentLink3URL: https://lcsc.com/product-detail/Multilayer-Ceramic-Capacitors-MLCC---SMD-SMT_Walsin-Tech-Corp-Walsin-Tech-Corp-0603N131J500CT_C237179.html
footprint CAP-0603 (0603 (1608M) Capacitor)
pins: 1, 2

## 0603N150F500CT
designator C?  Capacitance: 15pF  (hidden comment: *)
Capacitor, Ceramic (MLCC), 15pF, ±1%, 50V, NP0, ±1%, SMD 0603; Manufacturer: Walsin Tech Corp; Manufacturer Part Number: 0603N150F500CT; Package Size: 0603; JLCPCB Basic Part: No; JLCPCB Part Number: C458893; Supplier 1: LCSC; Category: Capacitors - MLCC; Supplier Part Number 1: C458893; Tolerance: ±1%; Voltage Rating: 50V; Temperature Coefficient: NP0; RoHS: Yes; ComponentLink1Description: Datasheet; ComponentLink1URL: https://wmsc.lcsc.com/wmsc/upload/file/pdf/v2/lcsc/2304140030_Walsin-Tech-Corp-0603N150F500CT_C458893.pdf; ComponentLink2Description: JLCPCB Part URL; ComponentLink2URL: https://jlcpcb.com/partdetail/C458893; ComponentLink3Description: LCSC Part URL; ComponentLink3URL: https://lcsc.com/product-detail/Multilayer-Ceramic-Capacitors-MLCC---SMD-SMT_Walsin-Tech-Corp-Walsin-Tech-Corp-0603N150F500CT_C458893.html
footprint CAP-0603 (0603 (1608M) Capacitor)
pins: 1, 2
